# Altium footprint library Library 3D.PcbLib: 288 footprints (part 7 of 18)
Each footprint in its own frame and in the unit in brackets; x right, y up, seen from the top. Pads: shape width x height; smd on the part's side, far side on the other; paste and mask are expansions set on the pad; w line width, h text height; cw(c..) or ccw(c..) is an arc to the next point about the centre after c.
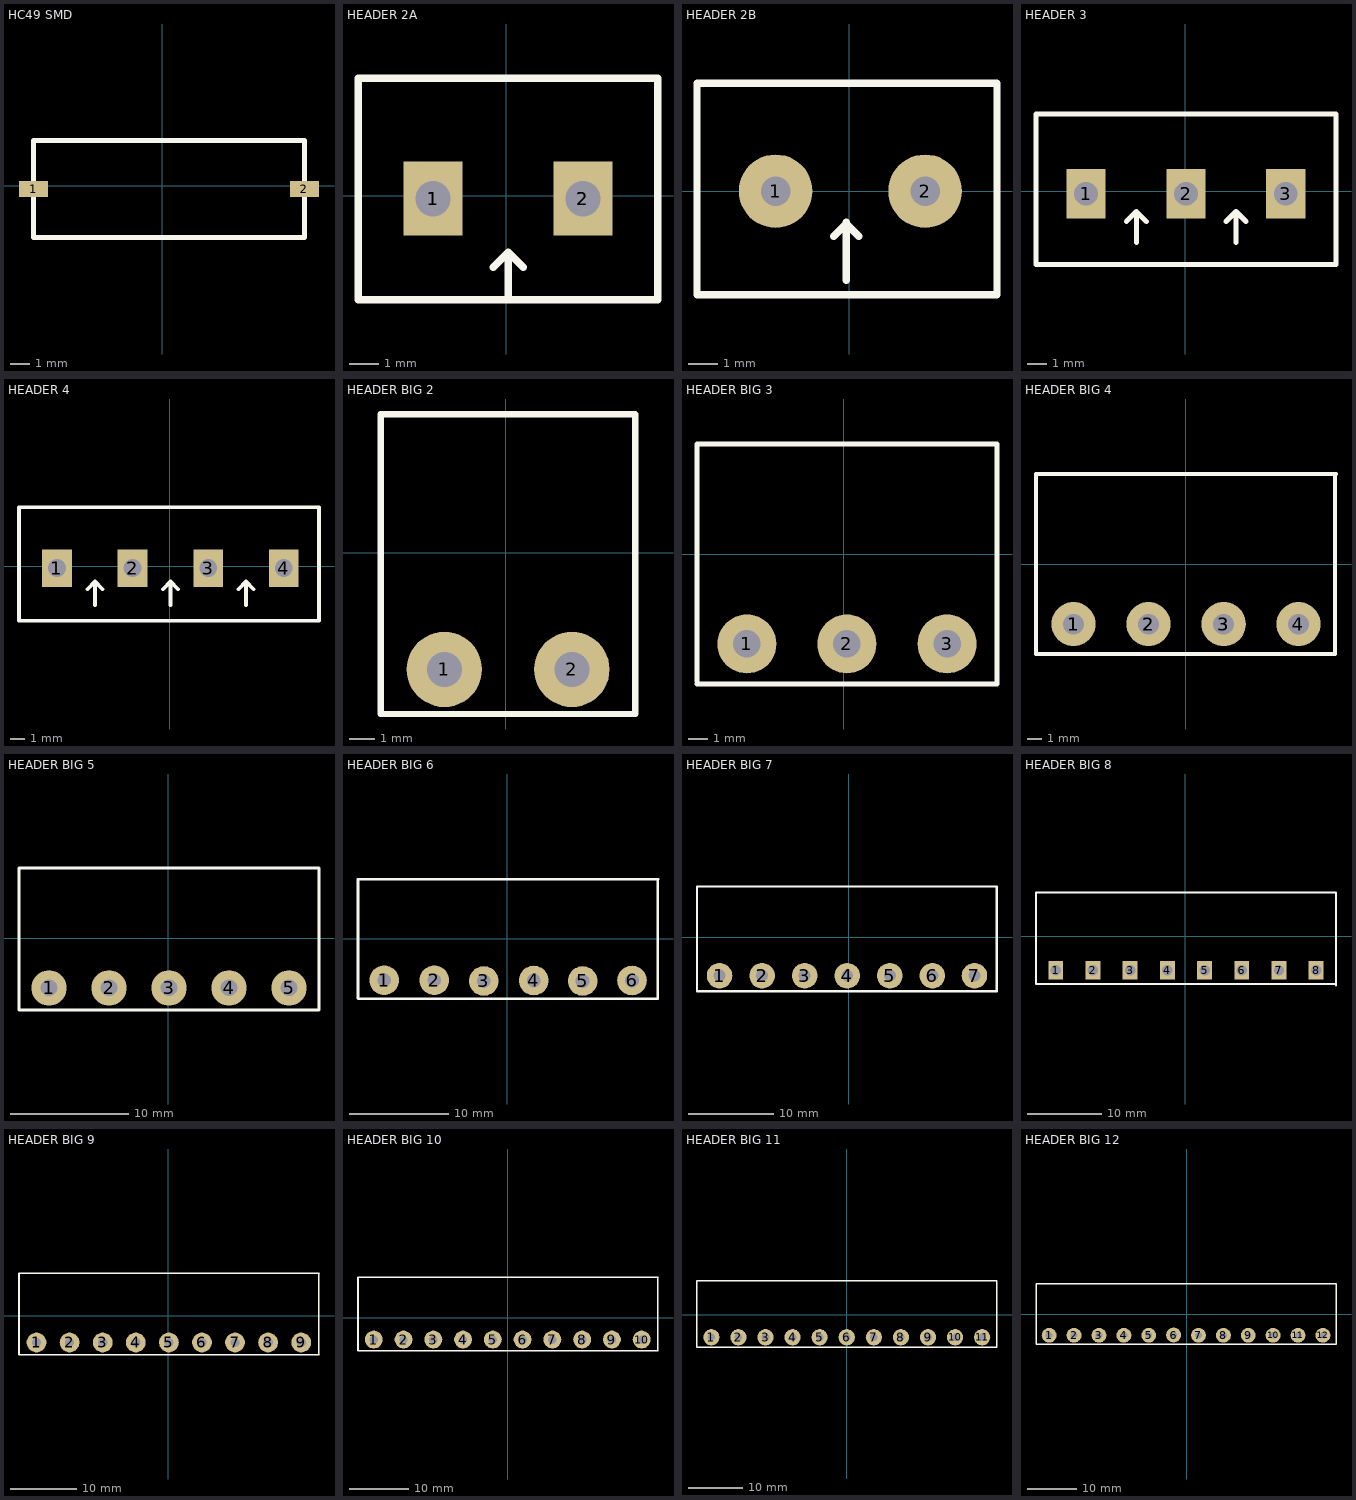
[diagram p6: the footprints below, top view; thin cyan lines are the x and y axes]

## HC49 SMD [mm]
pads (2):
  rect 1.5x0.8 smd: 1(-6.6,-0.175) 2(7.3,-0.175)
Top Overlay:
  lines w0.254: -6.6,-2.675 -6.6,2.325 7.3,2.325 7.3,-2.675 -6.6,-2.675
3D body "User Library-HC49_Crystal_SM.STEP": height 4.5, standoff -0.01, extent -6.6,-2.675 7.3,2.325

## HEADER 2A [mm]
pads (4):
  rect 2x2.5 hole 1.2: 1(-2.485,-0.093) 1(-2.485,-0.093) 2(2.595,-0.093) 2(2.595,-0.093)
Top Overlay:
  lines w0.254: -5.025,-3.522 -5.025,3.984 ; -5.025,-3.522 5.135,-3.522 ; -5.025,-3.522 -5.025,3.984 ; -5.025,-3.522 5.135,-3.522 ; -5.025,3.984 5.135,3.984 ; -5.025,3.984 5.135,3.984 ; 0.068,-1.909 -0.44,-2.417 0.068,-1.909 ; 0.068,-1.909 0.576,-2.417 0.068,-1.909 ; 0.068,-1.909 0.068,-3.471 0.068,-1.909 ; 5.135,-3.522 5.135,3.984 ; 5.135,-3.522 5.135,3.984
3D body "SW3DPS-HDR1x2-MED-GREEN.STEP": height 10, standoff -4, extent -4.945,-3.522 5.055,3.978
3D body "SW3DPS-HDR1x2-MED-GREEN.STEP": height 10, standoff -4, extent -4.945,-3.522 5.055,3.978

## HEADER 2B [mm]
pads (2):
  round 2.5 hole 1: 1(-2.5,0) 2(2.58,0)
Top Overlay:
  lines w0.254: -0.525,-1.525 -0.1,-1.1 ; -0.1,-3.025 -0.1,-1.05 ; 0.325,-1.525 -0.1,-1.1 ; -0.1,-1.1 -0.1,-1.05 ; -0.1,-1.1 -0.1,-1.05 ; -5.175,-3.525 -5.175,3.675 5.025,3.675 5.025,-3.525 -5.175,-3.525
3D body "fjhfjhfjhjfhfjlfjh.STEP": height 10.02, standoff -5.68, extent -5.175,-3.525 5.025,3.675

## HEADER 3 [mm]
pads (3):
  rect 2x2.5 hole 1.2: 1(-5.048,-0.138) 2(0.032,-0.138) 3(5.099,-0.138)
Top Overlay:
  lines w0.254: -3.003,-1.548 -2.495,-1.04 ; -2.495,-2.602 -2.495,-1.04 ; -1.987,-1.548 -2.495,-1.04 ; 2.064,-1.548 2.572,-1.04 ; 2.572,-2.602 2.572,-1.04 ; 3.08,-1.548 2.572,-1.04 ; -7.588,-3.719 -7.588,3.926 7.652,3.926 7.652,-3.719 -7.588,-3.719
3D body "SW3DPS-HDR1x3-MED-GREEN.STEP": height 10, standoff -4, extent -7.468,-3.643 7.532,3.857

## HEADER 4 [mm]
pads (4):
  rect 2x2.5 hole 1.2: 1(-7.583,-0.12) 2(-2.503,-0.12) 3(2.564,-0.12) 4(7.632,-0.12)
Top Overlay:
  lines w0.254: -5.538,-1.53 -5.03,-1.022 ; -5.03,-2.584 -5.03,-1.022 ; -4.522,-1.53 -5.03,-1.022 ; -0.471,-1.53 0.037,-1.022 ; 0.037,-2.584 0.037,-1.022 ; 0.545,-1.53 0.037,-1.022 ; 4.596,-1.53 5.104,-1.022 ; 5.104,-2.584 5.104,-1.022 ; 5.612,-1.53 5.104,-1.022 ; -10.123,-3.651 -10.123,3.969 9.994,3.969 9.994,-3.651 -10.123,-3.651
3D body "SW3DPS-HDR1x4-MED-GREEN.STEP": height 10, standoff -4, extent -10.014,-3.581 9.986,3.919

## HEADER BIG 2 [mm]
pads (2):
  round 3 hole 1.4: 1(-2.45,-4.65) 2(2.63,-4.65)
Top Overlay:
  lines w0.254: -4.99,5.51 5.16,5.51 5.16,-6.425 -4.99,-6.425 -4.99,5.523
3D body "User Library-BigHeader 5EHDR_1P.step": height 3.15, standoff -9.32, extent 0.05,-6.4 5.05,5.6
3D body "User Library-BigHeader 5EHDR_1P.step": height 3.15, standoff -9.32, extent -4.95,-6.4 0.05,5.6

## HEADER BIG 3 [mm]
pads (3):
  round 3 hole 1.4: 1(-4.925,-4.55) 2(0.155,-4.55) 3(5.248,-4.55)
Top Overlay:
  lines w0.254: -7.465,-6.582 7.788,-6.582 7.788,5.61 -7.465,5.61 -7.465,-6.455
3D body "User Library-BigHeader 5EHDR_1P.step": height 3.15, standoff -9.32, extent 2.668,-6.3 7.668,5.7
3D body "User Library-BigHeader 5EHDR_1P.step": height 3.15, standoff -9.32, extent -2.332,-6.3 2.668,5.7
3D body "User Library-BigHeader 5EHDR_1P.step": height 3.15, standoff -9.32, extent -7.332,-6.3 -2.332,5.7

## HEADER BIG 4 [mm]
pads (7):
  round 3 hole 1.4: 1(-7.6,-4.05) 1(-7.6,-4.05) 2(-2.52,-4.05) 2(-2.52,-4.05) 3(2.56,-4.05) 3(2.573,-4.05) 4(7.64,-4.05)
Top Overlay:
  lines w0.254: 5.113,-6.082 -10.14,-6.082 0.02,-6.082 10.115,-6.082 10.115,6.123 -10.127,6.123 -10.14,6.123 -10.14,-5.955 -10.14,6.11 ; 5.113,6.11 -10.14,6.11 ; 10.18,6.11 -10.14,6.11
3D body "User Library-BigHeader 5EHDR_1P.step": height 3.15, standoff -9.32, extent 4.98,-5.8 9.98,6.2
3D body "User Library-BigHeader 5EHDR_1P.step": height 3.15, standoff -9.32, extent -0.02,-5.8 4.98,6.2
3D body "User Library-BigHeader 5EHDR_1P.step": height 3.15, standoff -9.32, extent -5.02,-5.8 -0.02,6.2
3D body "User Library-BigHeader 5EHDR_1P.step": height 3.15, standoff -9.32, extent -10.02,-5.8 -5.02,6.2

## HEADER BIG 5 [mm]
pads (5):
  round 3 hole 1.4: 1(-10.1,-4.225) 2(-5.02,-4.225) 3(0.06,-4.225) 4(5.14,-4.225) 5(10.22,-4.225)
Top Overlay:
  lines w0.254: -12.64,5.935 -12.64,-6.1 -2.637,-6.1 12.76,-6.1 12.76,5.935 ; -12.64,5.935 -3.852,5.935 12.76,5.935 ; -12.64,5.935 12.76,5.935
3D body "User Library-BigHeader 5EHDR_1P.step": height 3.15, standoff -9.32, extent 7.48,-5.975 12.48,6.025
3D body "User Library-BigHeader 5EHDR_1P.step": height 3.15, standoff -9.32, extent 2.48,-5.975 7.48,6.025
3D body "User Library-BigHeader 5EHDR_1P.step": height 3.15, standoff -9.32, extent -2.52,-5.975 2.48,6.025
3D body "User Library-BigHeader 5EHDR_1P.step": height 3.15, standoff -9.32, extent -7.52,-5.975 -2.52,6.025
3D body "User Library-BigHeader 5EHDR_1P.step": height 3.15, standoff -9.32, extent -12.52,-5.975 -7.52,6.025

## HEADER BIG 6 [mm]
pads (6):
  round 3 hole 1.4: 1(-12.45,-4.2) 2(-7.37,-4.2) 3(-2.356,-4.275) 4(2.699,-4.224) 5(7.652,-4.275) 6(12.656,-4.224)
Top Overlay:
  lines w0.254: -15.1,-6.05 -15.1,6.05 15.285,6.05 15.272,6.037 15.272,-6.079 15.251,-6.1 -15.05,-6.1 -15.1,-6.05
3D body "User Library-BigHeader 5EHDR_1P.step": height 3.15, standoff -9.32, extent 10.13,-5.95 15.13,6.05
3D body "User Library-BigHeader 5EHDR_1P.step": height 3.15, standoff -9.32, extent 5.13,-5.95 10.13,6.05
3D body "User Library-BigHeader 5EHDR_1P.step": height 3.15, standoff -9.32, extent 0.13,-5.95 5.13,6.05
3D body "User Library-BigHeader 5EHDR_1P.step": height 3.15, standoff -9.32, extent -4.87,-5.95 0.13,6.05
3D body "User Library-BigHeader 5EHDR_1P.step": height 3.15, standoff -9.32, extent -9.87,-5.95 -4.87,6.05
3D body "User Library-BigHeader 5EHDR_1P.step": height 3.15, standoff -9.32, extent -14.87,-5.95 -9.87,6.05

## HEADER BIG 7 [mm]
pads (7):
  round 3 hole 1.4: 1(-15.167,-4.5) 2(-10.163,-4.5) 3(-5.159,-4.5) 4(-0.156,-4.5) 5(4.848,-4.5) 6(9.852,-4.5) 7(14.8,-4.5)
Top Overlay:
  lines w0.254: -17.817,-6.35 -17.817,5.95 ; -17.817,-6.325 17.425,-6.325 17.425,5.95 17.45,5.975 -17.817,5.975
3D body "User Library-BigHeader 5EHDR_1P.step": height 3.15, standoff -9.32, extent 7.352,-6.25 12.352,5.75
3D body "User Library-BigHeader 5EHDR_1P.step": height 3.15, standoff -9.32, extent 2.348,-6.25 7.348,5.75
3D body "User Library-BigHeader 5EHDR_1P.step": height 3.15, standoff -9.32, extent -2.656,-6.25 2.344,5.75
3D body "User Library-BigHeader 5EHDR_1P.step": height 3.15, standoff -9.32, extent -7.659,-6.25 -2.659,5.75
3D body "User Library-BigHeader 5EHDR_1P.step": height 3.15, standoff -9.32, extent -12.663,-6.25 -7.663,5.75
3D body "User Library-BigHeader 5EHDR_1P.step": height 3.15, standoff -9.32, extent -17.667,-6.25 -12.667,5.75
3D body "User Library-BigHeader 5EHDR_1P.step": height 3.15, standoff -9.32, extent 12.325,-6.225 17.325,5.775

## HEADER BIG 8 [mm]
pads (8):
  rect 2x2.5 hole 1.4: 1(-17.442,-4.575) 2(-12.438,-4.575) 3(-7.434,-4.575) 4(-2.43,-4.575) 5(2.574,-4.575) 6(7.577,-4.575) 7(12.581,-4.575) 8(17.585,-4.575)
Top Overlay:
  lines w0.254: 20.25,-6.607 20.25,5.875 -20.092,5.875 -20.092,-6.425 20.25,-6.425
3D body "User Library-BigHeader 5EHDR_1P.step": height 3.15, standoff -9.32, extent 15.085,-6.325 20.085,5.675
3D body "User Library-BigHeader 5EHDR_1P.step": height 3.15, standoff -9.32, extent 10.081,-6.325 15.081,5.675
3D body "User Library-BigHeader 5EHDR_1P.step": height 3.15, standoff -9.32, extent 5.077,-6.325 10.077,5.675
3D body "User Library-BigHeader 5EHDR_1P.step": height 3.15, standoff -9.32, extent 0.074,-6.325 5.074,5.675
3D body "User Library-BigHeader 5EHDR_1P.step": height 3.15, standoff -9.32, extent -4.93,-6.325 0.07,5.675
3D body "User Library-BigHeader 5EHDR_1P.step": height 3.15, standoff -9.32, extent -9.934,-6.325 -4.934,5.675
3D body "User Library-BigHeader 5EHDR_1P.step": height 3.15, standoff -9.32, extent -14.938,-6.325 -9.938,5.675
3D body "User Library-BigHeader 5EHDR_1P.step": height 3.15, standoff -9.32, extent -19.942,-6.325 -14.942,5.675

## HEADER BIG 9 [mm]
pads (9):
  round 3 hole 1.4: 1(-19.916,-4.05) 2(-14.912,-4.05) 3(-9.908,-4.05) 4(-4.904,-4.05) 5(0.099,-4.05) 6(5.103,-4.05) 7(10.107,-4.05) 8(15.107,-4.05) 9(20.106,-4.05)
Top Overlay:
  lines w0.254: 22.771,-5.9 22.771,6.4 ; 22.8,-5.9 -22.566,-5.9 -22.566,6.4 22.8,6.4
3D body "User Library-BigHeader 5EHDR_1P.step": height 3.15, standoff -9.32, extent -22.416,-5.8 -17.416,6.2
3D body "User Library-BigHeader 5EHDR_1P.step": height 3.15, standoff -9.32, extent -17.412,-5.8 -12.412,6.2
3D body "User Library-BigHeader 5EHDR_1P.step": height 3.15, standoff -9.32, extent -12.408,-5.8 -7.408,6.2
3D body "User Library-BigHeader 5EHDR_1P.step": height 3.15, standoff -9.32, extent -7.404,-5.8 -2.404,6.2
3D body "User Library-BigHeader 5EHDR_1P.step": height 3.15, standoff -9.32, extent -2.401,-5.8 2.599,6.2
3D body "User Library-BigHeader 5EHDR_1P.step": height 3.15, standoff -9.32, extent 2.603,-5.8 7.603,6.2
3D body "User Library-BigHeader 5EHDR_1P.step": height 3.15, standoff -9.32, extent 7.607,-5.8 12.607,6.2
3D body "User Library-BigHeader 5EHDR_1P.step": height 3.15, standoff -9.32, extent 12.607,-5.8 17.607,6.2
3D body "User Library-BigHeader 5EHDR_1P.step": height 3.15, standoff -9.32, extent 17.606,-5.8 22.606,6.2

## HEADER BIG 10 [mm]
pads (10):
  round 3 hole 1.4: 1(-22.457,-3.675) 2(-17.457,-3.675) 3(-12.457,-3.675) 4(-7.464,-3.675) 5(-2.464,-3.675) 6(2.536,-3.675) 7(7.536,-3.675) 8(12.536,-3.675) 9(17.535,-3.675) 10(22.534,-3.675)
Top Overlay:
  lines w0.254: 25.199,-5.525 25.199,6.775 ; 25.275,-5.525 -25.107,-5.525 -25.107,6.775 25.275,6.775
3D body "User Library-BigHeader 5EHDR_1P.step": height 3.15, standoff -9.32, extent 20.034,-5.425 25.034,6.575
3D body "User Library-BigHeader 5EHDR_1P.step": height 3.15, standoff -9.32, extent 15.035,-5.425 20.035,6.575
3D body "User Library-BigHeader 5EHDR_1P.step": height 3.15, standoff -9.32, extent 10.036,-5.425 15.036,6.575
3D body "User Library-BigHeader 5EHDR_1P.step": height 3.15, standoff -9.32, extent 5.036,-5.425 10.036,6.575
3D body "User Library-BigHeader 5EHDR_1P.step": height 3.15, standoff -9.32, extent 0.036,-5.425 5.036,6.575
3D body "User Library-BigHeader 5EHDR_1P.step": height 3.15, standoff -9.32, extent -4.964,-5.425 0.036,6.575
3D body "User Library-BigHeader 5EHDR_1P.step": height 3.15, standoff -9.32, extent -9.964,-5.425 -4.964,6.575
3D body "User Library-BigHeader 5EHDR_1P.step": height 3.15, standoff -9.32, extent -14.957,-5.425 -9.957,6.575
3D body "User Library-BigHeader 5EHDR_1P.step": height 3.15, standoff -9.32, extent -19.957,-5.425 -14.957,6.575
3D body "User Library-BigHeader 5EHDR_1P.step": height 3.15, standoff -9.32, extent -24.957,-5.425 -19.957,6.575

## HEADER BIG 11 [mm]
pads (11):
  round 3 hole 1.4: 1(-25.014,-4.175) 2(-20.016,-4.175) 3(-15.016,-4.175) 4(-10.016,-4.175) 5(-5.016,-4.175) 6(-0.016,-4.175) 7(4.984,-4.175) 8(9.987,-4.175) 9(14.986,-4.175) 10(19.985,-4.175) 11(24.984,-4.175)
Top Overlay:
  lines w0.254: 27.649,-6.025 27.649,6.275 ; 27.725,-6.025 -27.664,-6.025 -27.664,6.275 27.725,6.275
3D body "User Library-BigHeader 5EHDR_1P.step": height 3.15, standoff -9.32, extent 22.484,-5.925 27.484,6.075
3D body "User Library-BigHeader 5EHDR_1P.step": height 3.15, standoff -9.32, extent -27.514,-5.925 -22.514,6.075
3D body "User Library-BigHeader 5EHDR_1P.step": height 3.15, standoff -9.32, extent -22.516,-5.925 -17.516,6.075
3D body "User Library-BigHeader 5EHDR_1P.step": height 3.15, standoff -9.32, extent -17.516,-5.925 -12.516,6.075
3D body "User Library-BigHeader 5EHDR_1P.step": height 3.15, standoff -9.32, extent -12.516,-5.925 -7.516,6.075
3D body "User Library-BigHeader 5EHDR_1P.step": height 3.15, standoff -9.32, extent -7.516,-5.925 -2.516,6.075
3D body "User Library-BigHeader 5EHDR_1P.step": height 3.15, standoff -9.32, extent -2.516,-5.925 2.484,6.075
3D body "User Library-BigHeader 5EHDR_1P.step": height 3.15, standoff -9.32, extent 2.484,-5.925 7.484,6.075
3D body "User Library-BigHeader 5EHDR_1P.step": height 3.15, standoff -9.32, extent 7.487,-5.925 12.487,6.075
3D body "User Library-BigHeader 5EHDR_1P.step": height 3.15, standoff -9.32, extent 12.486,-5.925 17.486,6.075
3D body "User Library-BigHeader 5EHDR_1P.step": height 3.15, standoff -9.32, extent 17.485,-5.925 22.485,6.075

## HEADER BIG 12 [mm]
pads (12):
  round 3 hole 1.4: 1(-27.65,-4.2) 2(-22.646,-4.2) 3(-17.642,-4.2) 4(-12.639,-4.2) 5(-7.635,-4.2) 6(-2.631,-4.149) 7(2.365,-4.2) 8(7.365,-4.2) 9(12.365,-4.2) 10(17.365,-4.2) 11(22.365,-4.2) 12(27.365,-4.2)
Top Overlay:
  lines w0.254: -30.3,-6.05 30.005,-6.05 30.005,6.2 -30.3,6.2 -30.3,-6.05
3D body "User Library-BigHeader 5EHDR_1P.step": height 3.15, standoff -9.32, extent 24.865,-5.95 29.865,6.05
3D body "User Library-BigHeader 5EHDR_1P.step": height 3.15, standoff -9.32, extent 14.865,-5.95 19.865,6.05
3D body "User Library-BigHeader 5EHDR_1P.step": height 3.15, standoff -9.32, extent 9.865,-5.95 14.865,6.05
3D body "User Library-BigHeader 5EHDR_1P.step": height 3.15, standoff -9.32, extent 4.865,-5.95 9.865,6.05
3D body "User Library-BigHeader 5EHDR_1P.step": height 3.15, standoff -9.32, extent -0.135,-5.95 4.865,6.05
3D body "User Library-BigHeader 5EHDR_1P.step": height 3.15, standoff -9.32, extent -5.135,-5.95 -0.135,6.05
3D body "User Library-BigHeader 5EHDR_1P.step": height 3.15, standoff -9.32, extent -10.135,-5.95 -5.135,6.05
3D body "User Library-BigHeader 5EHDR_1P.step": height 3.15, standoff -9.32, extent -15.139,-5.95 -10.139,6.05
3D body "User Library-BigHeader 5EHDR_1P.step": height 3.15, standoff -9.32, extent -20.142,-5.95 -15.142,6.05
3D body "User Library-BigHeader 5EHDR_1P.step": height 3.15, standoff -9.32, extent -25.146,-5.95 -20.146,6.05
3D body "User Library-BigHeader 5EHDR_1P.step": height 3.15, standoff -9.32, extent -30.15,-5.95 -25.15,6.05
3D body "User Library-BigHeader 5EHDR_1P.step": height 3.15, standoff -9.32, extent 19.865,-5.95 24.865,6.05